# Altium footprint library 容阻感.PcbLib: 66 footprints (part 1 of 5)
Each footprint in its own frame and in the unit in brackets; x right, y up, seen from the top. Pads: shape width x height; smd on the part's side, far side on the other; paste and mask are expansions set on the pad; w line width, h text height; cw(c..) or ccw(c..) is an arc to the next point about the centre after c.
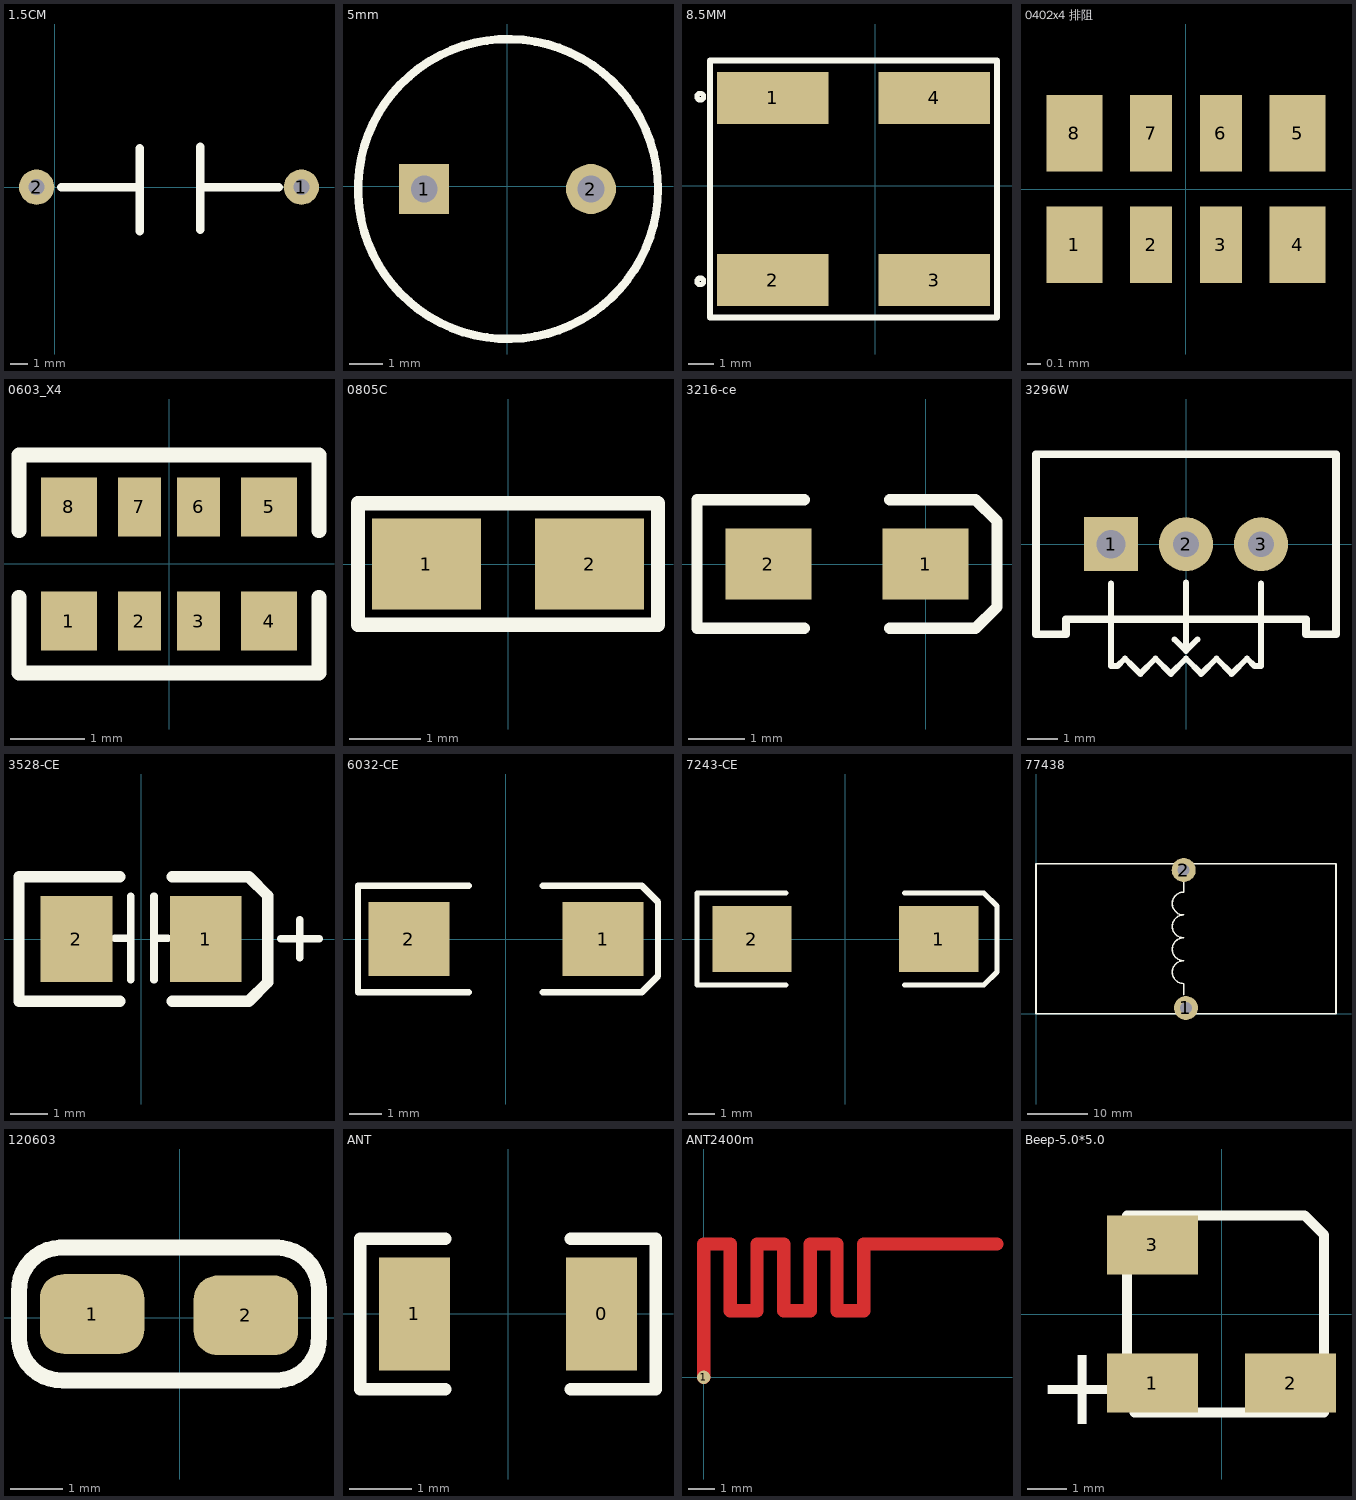
[diagram p0: the footprints below, top view; thin cyan lines are the x and y axes]

## 1.5CM [mm] "CBB"
pads (2):
  round 2 hole 0.9: 1(13.984,0) 2(-1.016,0)
Top Overlay:
  lines w0.5: 0.381,0 4.826,0 ; 4.826,-0.079 4.826,-2.492 4.826,-1.318 4.826,1.032 4.826,2.207 ; 8.255,-2.413 8.255,2.286 8.255,0 12.7,0

## 5mm [mm] "插件"
pads (2):
  rect 1.5x1.5 hole 0.8: 1(-2.489,-0.076)
  round 1.5 hole 0.8: 2(2.515,-0.076)
Top Overlay:
  circle w0.254: c0.025,-0.076 r4.5

## 8.5MM [mm] "SMD8.5X8.5X5.5"
pads (4):
  rect 4.3x2 smd: 1(-3.937,3.383) 2(-3.937,-3.637) 3(2.283,-3.637) 4(2.283,3.383)
Top Overlay:
  circle w0.2: c-6.731,3.429 r0.127
  circle w0.2: c-6.731,-3.683 r0.127
  lines w0.229: -6.35,-5.08 -6.35,4.826 4.699,4.826 4.699,-5.08 -6.35,-5.08
3D body: height 5.5, standoff 0, extent -5.271,-4.381 3.492,4.128

## 0402x4 排阻 [mm]
pads (8):
  rect 0.4x0.55 smd mask+0.051: 1(-0.8,-0.4) 4(0.8,-0.4) 5(0.8,0.4) 8(-0.8,0.4)
  rect 0.3x0.55 smd mask+0.051: 2(-0.25,-0.4) 3(0.25,-0.4) 6(0.25,0.4) 7(-0.25,0.4)
3D body "User Library-741C083.step": height 0.35, standoff -0.03, extent -1,-0.502 1,0.502

## 0603_X4 [mm]
pads (8):
  rect 0.75x0.8 smd: 1(-1.35,-0.77) 4(1.35,-0.77) 5(1.35,0.77) 8(-1.35,0.77)
  rect 0.58x0.8 smd: 2(-0.4,-0.77) 3(0.4,-0.77) 6(0.4,0.77) 7(-0.4,0.77)
Top Overlay:
  lines w0.2: -2.025,-0.45 -2.025,-1.47 2.025,-1.47 2.025,-0.45 ; -2.025,0.45 -2.025,1.47 2.025,1.47 2.025,0.45
3D body "User Library-741C083.step": height 0.35, standoff -0.03, extent -0.984,-0.502 1.016,0.502

## 0805C [mil]
pads (2):
  rect 60x50 smd: 1(-45,0) 2(45,0)
Top Overlay:
  lines w7.87: -82.68,-33.46 -82.68,33.46 82.68,33.46 82.68,-33.46 -82.68,-33.46
3D body "User Library-cap_0805_lowprofile.step": height 37.4, standoff 0, extent -39.36,-23.62 39.37,23.63

## 3216-ce [mil]
pads (2):
  rect 60x50 smd: 1(0,0) 2(-110,0)
Top Overlay:
  lines w7.87: -85,-45 -160,-45 -160,45 -85,45 ; -25,-45 35,-45 50,-30 50,30 35,45 -25,45
3D body "User Library-AVX_ACASE.STEP": height 67.32, standoff 0, extent -121.93,-31.14 11.93,35

## 3296W [mm]
pads (3):
  rect 1.8x1.8 hole 0.95: 1(-2.5,0)
  round 1.8 hole 0.85: 2(0,0) 3(2.5,0)
Top Overlay:
  lines w0.2: -2.5,-1.31 -2.5,-4.064 -2.286,-4.064 -2.032,-3.81 -1.778,-4.064 -1.524,-4.318 -1.016,-3.81 -0.508,-4.318 0,-3.81 0.508,-4.318 1.016,-3.81 1.524,-4.318 2.032,-3.81 2.286,-4.064 2.5,-4.064 2.5,-1.31 ; -0.381,-3.175 0,-3.556 ; 0,-1.27 0,-3.556 ; 0.381,-3.175 0,-3.556
  lines w0.254: -5,-3 -5,3 5,3 5,-3 4,-3 4,-2.5 -4,-2.5 -4,-3 -5,-3
3D body "User Library-3296W.step": height 11.55, standoff -1.6, extent -4.765,-2.4 4.765,2.4

## 3528-CE [mil]
height 118.11
pads (2):
  rect 75x90 smd: 1(67.5,0) 2(-67.5,0)
Top Overlay:
  lines w7.87: 145.85,0.2 185.85,0.2 ; 165.85,-19.8 165.85,20.2
  lines w8: -27.38,0.79 -10.65,0.79 ; -10.65,-42.72 -10.65,44.69 ; 13.56,-42.72 13.56,44.69 ; 13.56,0.79 27.74,0.79
  lines w12: -22.5,-65 -127.5,-65 -127.5,65 -22.5,65 ; 32.5,-65 112.5,-65 132.5,-45 132.5,45 112.5,65 32.5,65
3D body "3528.STEP": height 82.22, standoff -0.46, extent -72.65,-55.51 72.65,55.51

## 6032-CE [mm]
pads (2):
  rect 2.5x2.286 smd: 1(3,0) 2(-3,0)
Top Overlay:
  lines w0.2: -1.143,-1.651 -4.572,-1.651 -4.572,1.651 -1.143,1.651 ; 1.143,-1.651 4.191,-1.651 4.699,-1.143 4.699,1.143 4.191,1.651 1.143,1.651
3D body "User Library-CAP_TANT_6032-28_y.STEP": height 2.8, standoff 0, extent -3.404,-1.524 2.896,1.976

## 7243-CE [mm]
pads (2):
  rect 3.048x2.54 smd: 1(3.6,0) 2(-3.6,0)
Top Overlay:
  lines w0.2: -2.286,-1.778 -5.715,-1.778 -5.715,1.778 -2.286,1.778 ; 2.286,-1.778 5.334,-1.778 5.842,-1.27 5.842,1.27 5.334,1.778 2.286,1.778
3D body "User Library-CAP_TANT_7343-40.STEP": height 4, standoff 0, extent -3.8,-2.413 3.8,2.187

## 77438 [mm]
height 50
pads (2):
  round 4 hole 2: 1(25,1) 2(24.638,24)
Top Overlay:
  lines w0.254: 24.638,20.316 ccw(c24.638,18.411) 24.638,16.506 ccw(c24.638,14.601) 24.638,12.696 ccw(c24.638,10.791) 24.639,8.886 ccw(c24.639,6.981) 24.639,5.076 24.639,3.176 ; 24.638,20.32 24.638,21.971 ; 0,0 0,25.019 50.038,25.019 50.038,0 0,0

## 120603 [mil] "兼容"
pads (2):
  rrect60% 78.74x60 smd: 1(-66,3) 2(50,2)
Top Overlay:
  lines w12: -90,53 ccw(c-89,21) -121,20 -121,-16 ccw(c-89,-15) -88,-47 72,-47 ; -88,53 30,53 74,53 ; 72,53 cw(c73,21) 105,22 105,-14 cw(c73,-15) 74,-47
3D body "R1206.STEP": height 23.62, standoff 0, extent -70.99,-29.49 55,33.5

## ANT [mm]
pads (2):
  rect 1.13x1.8 smd: 0(1.49,0) 1(-1.49,0)
Top Overlay:
  lines w0.2: -1,-1.2 -2.355,-1.2 -2.355,1.2 -1,1.2 ; 1,-1.2 2.355,-1.2 2.355,1.2 1,1.2
3D body "C1808.STEP": height 0.88, standoff -0.02, extent -2.25,-1 2.25,1

## ANT2400m [mm]
pads (1):
  round 0.5 smd: 1(0,0)
Top Layer:
  lines w0.5: 0,0 0,5 1,5 1,2.5 2,2.5 2,4.96 ; 2,5 3,5 3,2.5 4,2.5 4,4.99 ; 4,5 5,5 5,2.5 6,2.5 6,5 11,5

## Beep-5.0*5.0 [mm]
pads (3):
  rect 2.3x1.5 smd: 1(-1.75,-1.75) 2(1.75,-1.75) 3(-1.75,1.75)
Top Overlay:
  lines w0.254: -2.4,-2.301 -2.4,2.499 2.101,2.499 2.6,2 2.6,-2.501 -2.2,-2.501
  text "+" at -4.699,-2.794 h2.03
3D body: height 2, standoff 0, extent -2.413,-2.54 2.667,2.54